# Altium footprint library ParsaLibrary.PcbLib: 526 footprints (part 6 of 33)
Each footprint in its own frame and in the unit in brackets; x right, y up, seen from the top. Pads: shape width x height; smd on the part's side, far side on the other; paste and mask are expansions set on the pad; w line width, h text height; cw(c..) or ccw(c..) is an arc to the next point about the centre after c.
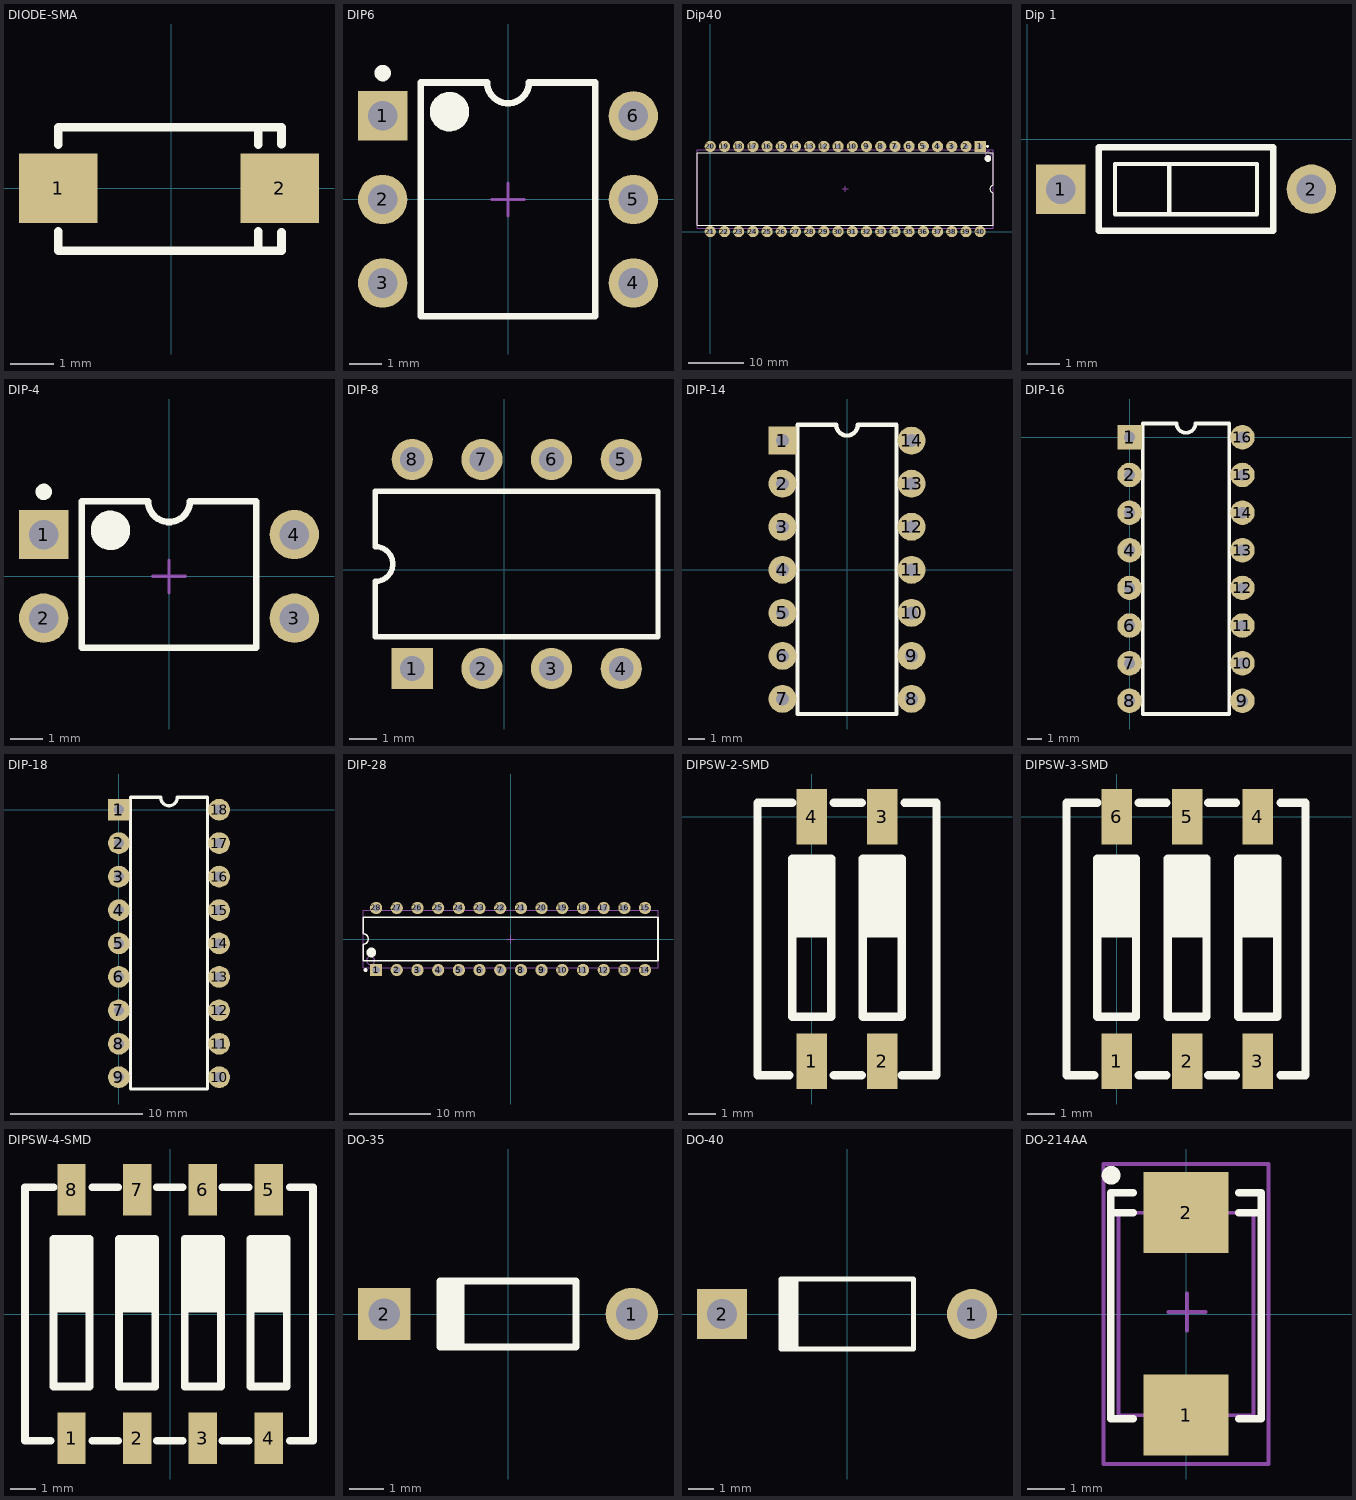
[diagram p5: the footprints below, top view; thin cyan lines are the x and y axes]

## DIODE-SMA [mm]
pads (2):
  rect 1.8x1.6 smd: 1(-2.6,0) 2(2.5,0)
Top Overlay:
  lines w0.2: -2.6,-1 -2.6,-1.444 2.446,-1.444 ; -2.6,1 -2.6,1.396 2.398,1.396 ; 2,-1 2,-1.444 2.537,-1.444 2.537,-1.013 ; 2,1.004 2,1.4 2.539,1.4 2.539,1.015
3D body "Diode SMA.stp": height 2.41, standoff 0, extent -2.653,-1.46 2.626,1.46

## DIP6 [mm]
pads (6):
  rect 1.5x1.5 hole 0.9: 1(-3.81,2.54)
  round 1.5 hole 0.9: 2(-3.81,0) 3(-3.81,-2.54) 4(3.81,-2.54) 5(3.81,0) 6(3.81,2.54)
Top Overlay:
  circle w0.25: c-3.81,3.84 r0.125
  circle w0.6: c-1.778,2.667 r0.3
  lines w0.2: -2.65,-3.556 -2.65,3.556 -0.635,3.556 ccw(c0,3.556) 0.635,3.556 2.65,3.556 2.65,-3.556 -2.65,-3.556
Mechanical 15:
  lines w0.1: -0.5,0 0.5,0 ; 0,-0.5 0,0.5
3D body "User Library-DIP6.STEP": height 5.3, standoff -2, extent -3.806,-3.56 4.064,3.56

## Dip40 [mm] "40pin Dip IC"
pads (40):
  rect 2x2 hole 0.9: 1(48.26,15.24)
  round 2 hole 0.9: 2(45.72,15.24) 3(43.18,15.24) 4(40.64,15.24) 5(38.1,15.24) 6(35.56,15.24) 7(33.02,15.24) 8(30.48,15.24) 9(27.94,15.24) 10(25.4,15.24) 11(22.86,15.24) 12(20.32,15.24) 13(17.78,15.24) 14(15.24,15.24) 15(12.7,15.24) 16(10.16,15.24) 17(7.62,15.24) 18(5.08,15.24) 19(2.54,15.24) 20(0,15.24) 21(0,0) 22(2.54,0) 23(5.08,0) 24(7.62,0) 25(10.16,0) 26(12.7,0) 27(15.24,0) 28(17.78,0) 29(20.32,0) 30(22.86,0) 31(25.4,0) 32(27.94,0) 33(30.48,0) 34(33.02,0) 35(35.56,0) 36(38.1,0) 37(40.64,0) 38(43.18,0) 39(45.72,0) 40(48.26,0)
Top Overlay:
  circle w0.25: c49.56,15.24 r0.125
  circle w0.6: c49.63,13.07 r0.3
  lines w0.2: -2.37,1.17 50.63,1.17 50.63,6.985 cw(c50.63,7.62) 50.63,8.255 50.63,14.07 -2.37,14.07 -2.37,1.17
Mechanical 13:
  circle w0.1: c49.705,13.77 r0.5
  lines w0.1: -2.345,0.57 -2.345,14.67 50.605,14.67 50.605,0.57 -2.345,0.57
Mechanical 15:
  lines w0.1: 23.63,7.62 24.63,7.62 ; 24.13,7.12 24.13,8.12

## Dip 1 [mm]
pads (2):
  rect 1.5x1.5 hole 0.9: 1(1.016,-1.524)
  round 1.5 hole 0.9: 2(8.636,-1.524)
Top Overlay:
  lines w0.127: 4.318,-2.286 4.318,-0.762 ; 2.667,-2.286 2.667,-0.762 6.985,-0.762 6.985,-2.286 2.667,-2.286
  lines w0.2: 5.461,-0.244 7.476,-0.244 7.476,-2.794 2.176,-2.794 2.176,-0.244 5.588,-0.244

## DIP-4 [mm]
pads (4):
  rect 1.5x1.5 hole 0.9: 1(-3.81,1.27)
  round 1.5 hole 0.9: 2(-3.81,-1.27) 3(3.81,-1.27) 4(3.81,1.27)
Top Overlay:
  circle w0.6: c-1.778,1.397 r0.3
  circle w0.25: c-3.81,2.57 r0.125
  lines w0.2: -2.65,-2.17 2.65,-2.17 2.65,2.286 0.635,2.286 cw(c0,2.286) -0.635,2.286 -2.65,2.286 -2.65,-2.17
Mechanical 15:
  lines w0.1: -0.5,0 0.5,0 ; 0,-0.5 0,0.5
3D body "CircuitWorks-DIP4.step": height 4.31, standoff -3.28, extent -3.9,-2.71 4.1,2.83

## DIP-8 [mm]
pads (8):
  rect 1.5x1.5 hole 0.9: 1(-3.353,-3.607)
  round 1.5 hole 0.9: 2(-0.813,-3.607) 3(1.727,-3.607) 4(4.267,-3.607) 5(4.267,4.013) 6(1.727,4.013) 7(-0.813,4.013) 8(-3.353,4.013)
Top Overlay:
  lines w0.2: -4.693,-2.447 5.607,-2.447 5.607,2.853 -4.693,2.853 -4.693,0.838 cw(c-4.693,0.203) -4.693,-0.432 -4.693,-2.447
3D body "DIP8N.STEP": height 3.59, standoff -3.26, extent -4.267,-4.086 5.233,4.441

## DIP-14 [mil]
pads (14):
  rect 65x65 hole 30: 1(-150,300)
  round 65 hole 30: 2(-150,200) 3(-150,100) 4(-150,0) 5(-150,-100) 6(-150,-200) 7(-150,-300) 8(150,-300) 9(150,-200) 10(150,-100) 11(150,0) 12(150,100) 13(150,200) 14(150,300)
Top Overlay:
  lines w10: -115,-335.14 -115,337 -25,337 ccw(c0,337) 25,337 115,337 115,-335.14 -115,-335.14
3D body "CircuitWorks-DIP-14.step": height 157.87, standoff -116.93, extent -156.72,-376.02 158.24,373.97

## DIP-16 [mil]
pads (16):
  rect 65x65 hole 30: 1(0,0)
  round 65 hole 30: 2(0,-100) 3(0,-200) 4(0,-300) 5(0,-400) 6(0,-500) 7(0,-600) 8(0,-700) 9(300,-700) 10(300,-600) 11(300,-500) 12(300,-400) 13(300,-300) 14(300,-200) 15(300,-100) 16(300,0)
Top Overlay:
  lines w10: 35,-735 265,-735 265,37 175,37 cw(c150,37) 125,37 35,37 35,-735
3D body "SW3dPS-DIP16-300.step": height 200, standoff -98.03, extent -4.92,-743.7 304.92,43.7

## DIP-18 [mil]
pads (18):
  rect 65x65 hole 30: 1(0,0)
  round 65 hole 30: 2(0,-100) 3(0,-200) 4(0,-300) 5(0,-400) 6(0,-500) 7(0,-600) 8(0,-700) 9(0,-800) 10(300,-800) 11(300,-700) 12(300,-600) 13(300,-500) 14(300,-400) 15(300,-300) 16(300,-200) 17(300,-100) 18(300,0)
Top Overlay:
  lines w10: 35,-835.24 265,-835.24 265,37 175,37 cw(c150,37) 125,37 35,37 35,-835.24
3D body "User Library-DIP-18P-M02.step": height 314.96, standoff 0, extent -7.02,-829.86 302.82,36.29
3D body "User Library-DIP18.step": height 136.77, standoff -113.06, extent -58.72,-852.12 354.66,48.24

## DIP-28 [mm]
pads (28):
  rect 1.5x1.5 hole 0.9: 1(-16.51,-3.785)
  round 1.5 hole 0.9: 2(-13.97,-3.785) 3(-11.43,-3.785) 4(-8.89,-3.785) 5(-6.35,-3.785) 6(-3.81,-3.785) 7(-1.27,-3.785) 8(1.27,-3.785) 9(3.81,-3.785) 10(6.35,-3.785) 11(8.89,-3.785) 12(11.43,-3.785) 13(13.97,-3.785) 14(16.51,-3.785) 15(16.51,3.835) 16(13.97,3.835) 17(11.43,3.835) 18(8.89,3.835) 19(6.35,3.835) 20(3.81,3.835) 21(1.27,3.835) 22(-1.27,3.835) 23(-3.81,3.835) 24(-6.35,3.835) 25(-8.89,3.835) 26(-11.43,3.835) 27(-13.97,3.835) 28(-16.51,3.835)
Top Overlay:
  circle w0.25: c-17.81,-3.785 r0.125
  circle w0.6: c-17.1,-1.625 r0.3
  lines w0.2: -18.1,-2.625 18.1,-2.625 18.1,2.675 -18.1,2.675 -18.1,0.66 cw(c-18.1,0.025) -18.1,-0.61 -18.1,-2.625
Mechanical 13:
  circle w0.1: c-17.2,-2.625 r0.5
  lines w0.1: -18.1,-3.525 18.1,-3.525 18.1,3.575 -18.1,3.575 -18.1,-3.525
Mechanical 15:
  lines w0.1: -0.5,0.025 0.5,0.025 ; 0,-0.475 0,0.525
3D body "User Library-28pin 0_3inch 2_54mm IC DIP Gold Socket.step": height 5, standoff -3, extent -17.7,-5.149 17.86,5.011
3D body "User Library-DIP-28P-M04.step": height 9.3, standoff 1.1, extent -17.657,-3.931 17.743,3.939

## DIPSW-2-SMD [mm]
pads (4):
  rect 1.1x2 smd: 1(0,-8.8) 2(2.54,-8.8) 3(2.54,0) 4(0,0)
Top Overlay:
  rectangle: 1.84,-4.35 3.24,-1.5
  rectangle: -0.7,-4.35 0.7,-1.5
  lines w0.3: -0.8,-9.3 -1.951,-9.3 -1.951,0.5 -0.7,0.5 ; -0.7,-3.5 0.7,-3.5 ; 0.8,-9.3 1.8,-9.3 ; 0.8,0.5 1.8,0.5 ; 1.84,-3.5 3.24,-3.5 ; 3.24,-9.3 4.495,-9.3 4.495,0.5 3.34,0.5 ; -0.7,-7.2 0.7,-7.2 0.7,-1.5 -0.7,-1.5 -0.7,-7.2 ; 1.84,-7.2 1.84,-1.5 3.24,-1.5 3.24,-7.2 1.84,-7.2
3D body "User Library-DIP SW 2P.step": height 4.05, standoff -0.1, extent -1.972,-9.356 4.579,0.544

## DIPSW-3-SMD [mm]
pads (6):
  rect 1.1x2 smd: 1(0,-8.8) 2(2.54,-8.8) 3(5.08,-8.8) 4(5.08,0) 5(2.54,0) 6(0,0)
Top Overlay:
  rectangle: -0.7,-4.35 0.7,-1.5
  rectangle: 1.84,-4.35 3.24,-1.5
  rectangle: 4.38,-4.35 5.78,-1.5
  lines w0.3: -0.8,-9.3 -1.8,-9.3 -1.8,0.5 -0.7,0.5 ; -0.7,-3.5 0.7,-3.5 ; 0.8,-9.3 1.8,-9.3 ; 0.8,0.5 1.8,0.5 ; 1.84,-3.5 3.24,-3.5 ; 3.3,-9.3 4.3,-9.3 ; 3.3,0.5 4.3,0.5 ; 4.38,-3.5 5.78,-3.5 ; 5.9,-9.3 6.8,-9.3 6.8,0.5 5.9,0.5 ; -0.7,-7.2 -0.7,-1.5 0.7,-1.5 0.7,-7.2 -0.7,-7.2 ; 1.84,-7.2 3.24,-7.2 3.24,-1.5 1.84,-1.5 1.84,-7.2 ; 4.38,-7.2 5.78,-7.2 5.78,-1.5 4.38,-1.5 4.38,-7.2
3D body "User Library-DM04V.STEP": height 4.47, standoff -0.05, extent -1.75,-9.29 6.799,0.49

## DIPSW-4-SMD [mm]
pads (8):
  rect 1.1x2 smd: 1(-3.81,-4.8) 2(-1.27,-4.8) 3(1.27,-4.8) 4(3.81,-4.8) 5(3.81,4.8) 6(1.27,4.8) 7(-1.27,4.8) 8(-3.81,4.8)
Top Overlay:
  rectangle: 0.57,0.05 1.97,2.9
  rectangle: -1.97,0.05 -0.57,2.9
  rectangle: -4.51,0.05 -3.11,2.9
  rectangle: 3.11,0.05 4.51,2.9
  lines w0.3: -4.61,-4.9 -5.61,-4.9 -5.61,4.9 -4.51,4.9 ; -4.51,0.9 -3.11,0.9 ; -3.01,-4.9 -2.01,-4.9 ; -3.01,4.9 -2.01,4.9 ; -1.97,0.9 -0.57,0.9 ; -0.51,-4.9 0.49,-4.9 ; -0.51,4.9 0.49,4.9 ; 0.57,0.9 1.97,0.9 ; 2.03,-4.9 3.03,-4.9 ; 2.03,4.9 3.03,4.9 ; 3.11,0.9 4.51,0.9 ; 4.63,-4.9 5.53,-4.9 5.53,4.9 4.63,4.9 ; -4.51,-2.8 -3.11,-2.8 -3.11,2.9 -4.51,2.9 -4.51,-2.8 ; -1.97,-2.8 -1.97,2.9 -0.57,2.9 -0.57,-2.8 -1.97,-2.8 ; 0.57,-2.8 0.57,2.9 1.97,2.9 1.97,-2.8 0.57,-2.8 ; 3.11,-2.8 3.11,2.9 4.51,2.9 4.51,-2.8 3.11,-2.8
3D body "User Library-DIP SW 4P.step": height 4.05, standoff -0.1, extent -5.825,-4.95 5.805,4.95

## DO-35 [mm]
pads (2):
  round 1.5 hole 0.9: 1(3.55,0)
  rect 1.5x1.5 hole 0.9: 2(-3.55,0)
Top Overlay:
  region: -1.25,0.95 -2.05,0.95 -2.05,-0.95 -1.25,-0.95
  lines w0.2: -1.95,-0.95 1.95,-0.95 1.95,0.95 -1.95,0.95
3D body "SW3dPS-do_35.STEP": height 1.89, standoff -2.29, extent -3.816,-0.875 3.816,0.875

## DO-40 [mm]
pads (2):
  round 2 hole 1.2: 1(5,0)
  rect 2x2 hole 1.2: 2(-5,0)
Top Overlay:
  region: -1.95,1.4 -2.75,1.4 -2.75,-1.4 -1.95,-1.4
  lines w0.2: -2.65,-1.4 2.65,-1.4 2.65,1.4 -2.65,1.4
3D body "DO_41_10mmPitch.step": height 2.8, standoff -2.4, extent -5.35,-1.3 5.35,1.304

## DO-214AA [mm]
pads (2):
  rect 2.26x2.16 smd: 1(0,-2.7) 2(0,2.7)
Top Overlay:
  circle w0.25: c-2,3.7 r0.125
  lines w0.2: -1.4,-2.8 -2,-2.8 -2,2.7 ; -1.4,2.7 -2,2.7 ; -1.4,3.237 -2,3.237 -2,2.7 ; 1.4,-2.8 2,-2.8 2,2.7 ; 1.4,2.7 2,2.7 ; 1.4,3.237 2,3.237 2,2.7
Mechanical 13:
  lines w0.1: -1.8,-2.7 -1.8,2.701 1.8,2.701 1.8,-2.7 -1.8,-2.7
Mechanical 15:
  lines w0.1: -0.474,0.051 0.526,0.051 ; 0.026,-0.449 0.026,0.551 ; -2.2,-4 -2.2,4 2.2,4 2.2,-4 -2.2,-4
3D body "User Library-DO-214AA SMB.step": height 2.3, standoff 0, extent -1.8,-2.7 1.8,2.7